# Altium footprint library pcb.PcbLib: 20 footprints (part 1 of 2)
Each footprint in its own frame and in the unit in brackets; x right, y up, seen from the top. Pads: shape width x height; smd on the part's side, far side on the other; paste and mask are expansions set on the pad; w line width, h text height; cw(c..) or ccw(c..) is an arc to the next point about the centre after c.
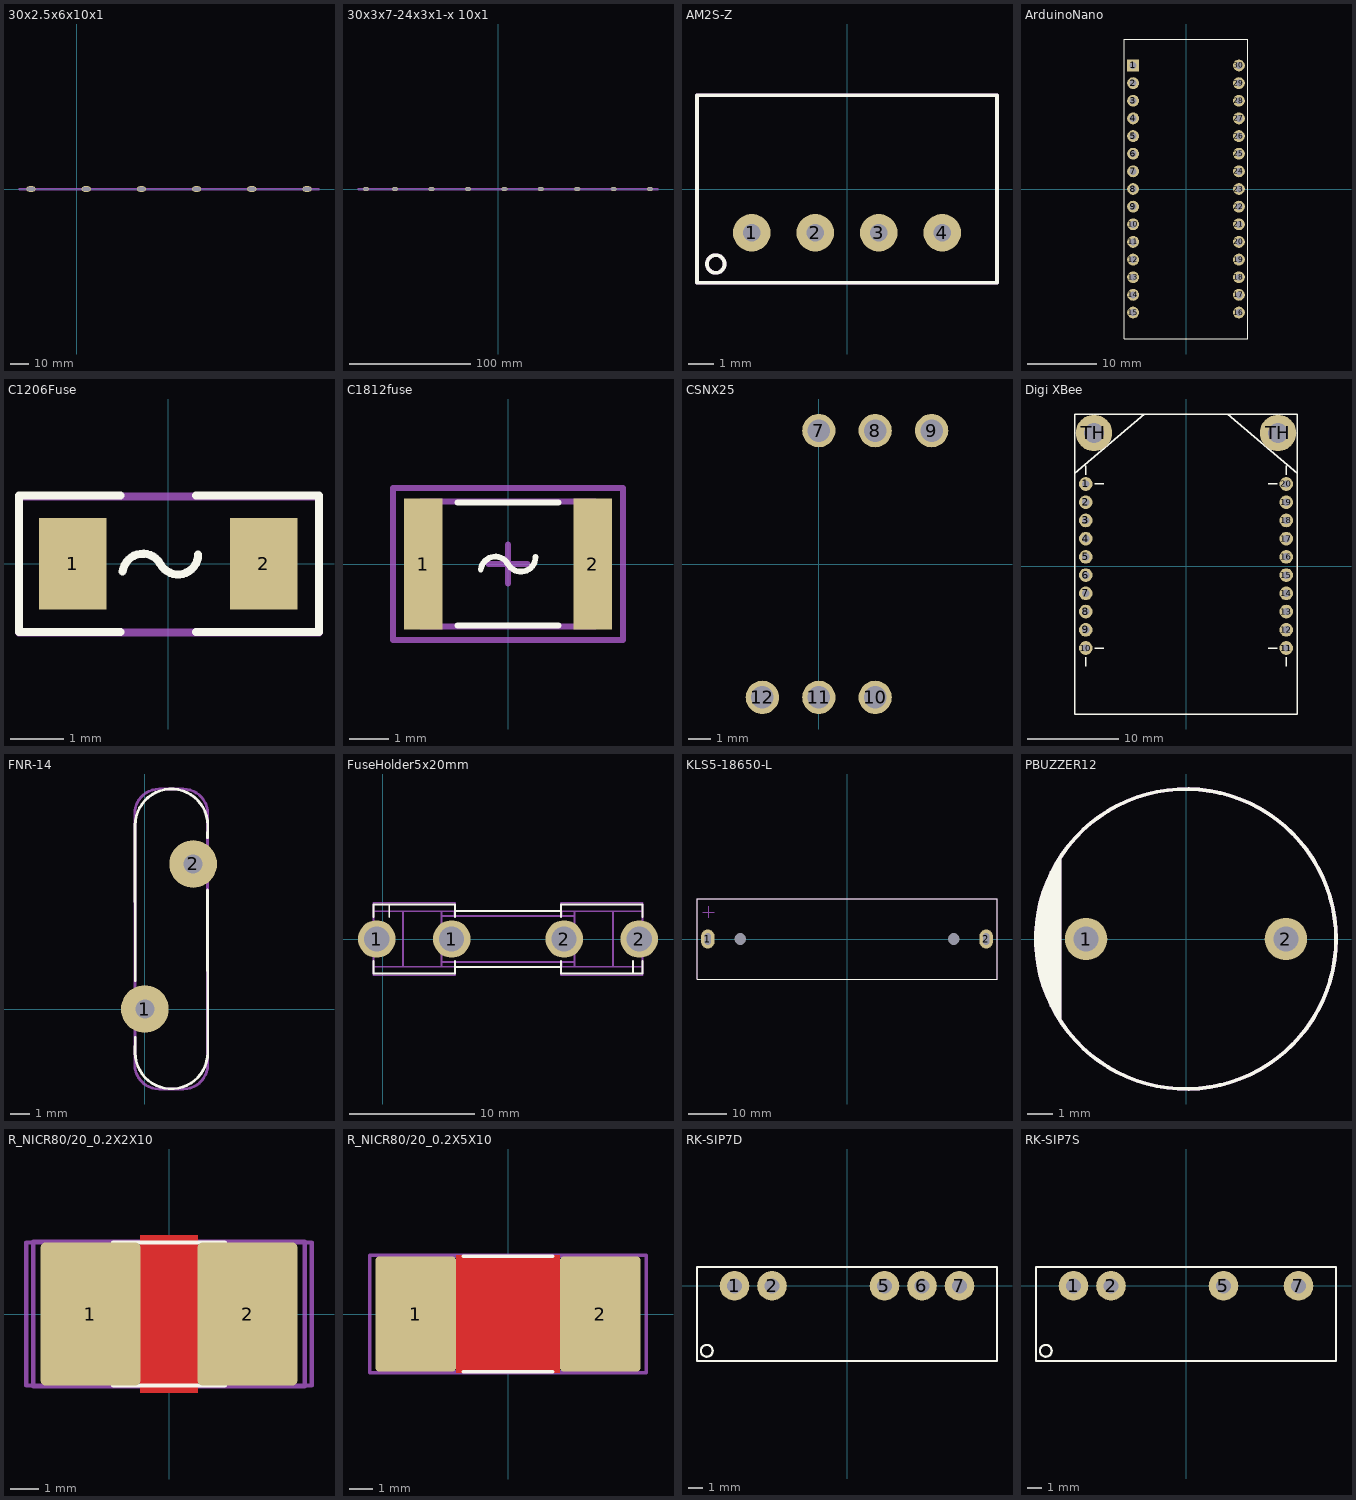
[diagram p0: the footprints below, top view; thin cyan lines are the x and y axes]

## 30х2.5х6х10х1 [mm]
height 10
pads (6):
  oval 5x3 hole 2 slot 4 at 0 deg: 0(-25,0) 0(5,0) 0(35,0) 0(65,0) 0(95,0) 0(125,0)
Top Assembly:
  lines w0.15: -31.5,-0.5 -31.5,0.5 131.5,0.5 131.5,-0.5 -31.5,-0.5
3D body "Шина 30х2.5х6 х 10х1.STEP": height 11, standoff -4, extent -31.5,-0.5 131.5,0.5

## 30х3х7-24х3х1-х 10х1 [mm]
height 10
pads (9):
  oval 5x3 hole 2 slot 4 at 0 deg: 0(-109,0) 0(-85,0) 0(-55,0) 0(-25,0) 0(5,0) 0(35,0) 0(65,0) 0(95,0) 0(125,0)
Top Assembly:
  lines w0.15: -115.5,-0.5 131.5,-0.5 131.5,0.5 -115.5,0.5 -115.5,-0.5
3D body "Шина 30х3х7-24х3х1-х 10х1.STEP": height 11, standoff -4, extent -115.5,-0.5 131.5,0.5

## AM2S-Z [mm]
height 11
pads (4):
  round 1.5 hole 0.7: 1(-3.81,-1.75) 2(-1.27,-1.75) 3(1.27,-1.75) 4(3.81,-1.75)
Top Overlay:
  circle w0.15: c-5.25,-3 r0.354
  lines w0.15: -6,-3.75 6,-3.75 6,3.75 -6,3.75 -6,-3.75
Top Assembly:
  circle w0.15: c-5.25,-3 r0.354
  lines w0.15: -6,-3.75 -6,3.75 6,3.75 6,-3.75 -6,-3.75
  text ".Designator" at -3,0.2 h1
3D body "AM2S-Z.STEP": height 9.65, standoff -2.5, extent -5.84,-3.75 5.84,3.75

## ArduinoNano [mm]
pads (30):
  rect 1.7x1.7 hole 1: 1(-7.62,17.78)
  round 1.7 hole 1: 2(-7.62,15.24) 3(-7.62,12.7) 4(-7.62,10.16) 5(-7.62,7.62) 6(-7.62,5.08) 7(-7.62,2.54) 8(-7.62,0) 9(-7.62,-2.54) 10(-7.62,-5.08) 11(-7.62,-7.62) 12(-7.62,-10.16) 13(-7.62,-12.7) 14(-7.62,-15.24) 15(-7.62,-17.78) 16(7.62,-17.78) 17(7.62,-15.24) 18(7.62,-12.7) 19(7.62,-10.16) 20(7.62,-7.62) 21(7.62,-5.08) 22(7.62,-2.54) 23(7.62,0) 24(7.62,2.54) 25(7.62,5.08) 26(7.62,7.62) 27(7.62,10.16) 28(7.62,12.7) 29(7.62,15.24) 30(7.62,17.78)
Top Overlay:
  lines w0.15: -8.89,-21.59 8.89,-21.59 8.89,21.59 -8.89,21.59 -8.89,-21.59
3D body "arduino_nano.STEP": height 12.6, standoff -6, extent -9,-21.6 9,23.4

## C1206Fuse [mm]
pads (2):
  rect 1.25x1.7 smd: 1(-1.775,0) 2(1.775,0)
Top Overlay:
  lines w0.15: -0.886,-1.27 -2.775,-1.27 -2.775,1.27 -0.886,1.27 ; -0.848,-0.142 cw(c-0.476,-0.186) -0.15,0 ccw(c0.18,0.178) 0.555,0.178 ; 0.511,-1.27 2.797,-1.27 2.797,1.27 0.511,1.27
Top Assembly:
  lines w0.15: -2.775,-1.275 -2.775,1.25 2.8,1.25 2.8,-1.275 -2.775,-1.275
  text ".Designator" at -2.5,-0.3 h1
3D body "User Library-nona SMD075F.STEP": height 0.56, standoff 0, extent -1.851,-0.85 1.351,0.802

## C1812fuse [mm]
height 1
pads (2):
  rect 1x3.35 smd: 1(-2.175,0) 2(2.175,0)
Top Overlay:
  lines w0.15: -1.3,-1.575 1.3,-1.575 ; -1.3,1.575 1.3,1.575 ; -0.698,-0.142 cw(c-0.326,-0.186) 0,0 ccw(c0.33,0.178) 0.705,0.178
Mechanical 15:
  lines w0.15: -0.5,0 0.5,0 ; 0,-0.5 0,0.5 ; -2.95,-1.95 2.95,-1.95 2.95,1.95 -2.95,1.95 -2.95,-1.95
Top Assembly:
  lines w0.15: -2.25,-1.6 2.25,-1.6 2.25,1.6 -2.25,1.6 -2.25,-1.6
  text ".Designator" at -2,-0.4 h1
3D body "C1812C.step": height 1, standoff 0, extent -2.25,-1.6 2.25,1.6

## CSNX25 [mm]
height 25.5
pads (6):
  round 1.5 hole 1: 7(0,6) 8(2.54,6) 9(5.08,6) 10(2.54,-6) 11(0,-6) 12(-2.54,-6)

## Digi XBee [mm]
pads (24):
  round 1.5 hole 0.8: 1(-11,9) 2(-11,7) 3(-11,5) 3(-11,5) 4(-11,3) 5(-11,1) 6(-11,-1) 7(-11,-3) 8(-11,-5) 9(-11,-7) 10(-11,-9) 11(11,-9) 11(11,-9) 12(11,-7) 13(11,-5) 14(11,-3) 15(11,-1) 16(11,1) 17(11,3) 18(11,5) 19(11,7) 20(11,9)
  round 4 hole 2.2: TH(-10.1,14.6) TH(10.1,14.6)
Top Overlay:
  lines w0.15: -11,-11 -11,-10 ; -11,10 -11,11 ; -10,-9 -9,-9 ; -10,9 -9,9 ; 4.191,16.679 12.192,16.679 12.192,10.177 ; 9,-9 10,-9 ; 9,9 10,9 ; 11,-11 11,-10 ; 11,10 11,11 ; -12.192,10.177 -12.192,-16.239 12.192,-16.239 12.192,10.177 ; -12.192,10.177 -4.572,16.679 ; -12.192,10.177 -12.192,16.679 -4.572,16.679 ; -4.572,16.679 4.572,16.679 12.192,10.177

## FNR-14 [mm]
pads (2):
  round 2.5 hole 1: 1(0,0) 2(2.54,7.62)
Top Overlay:
  lines w0.15: -0.5,-1.5 -0.508,-2.286 ccw(c1.397,-2.286) 3.302,-2.286 3.3,6.25 ; -0.5,1.5 -0.508,9.652 cw(c1.397,9.652) 3.302,9.652 3.3,9
Top Assembly:
  lines w0.15: -0.525,-2.93 ccw(c0.745,-2.93) 0.745,-4.2 2.03,-4.2 ccw(c2.03,-2.93) 3.3,-2.93 3.3,3.625 3.3,10.28 ccw(c2.03,10.28) 2.03,11.55 1.5,11.55 0.745,11.55 ccw(c0.745,10.28) -0.525,10.28 -0.525,3.725 -0.525,-2.93
  text ".Designator" at 0,3.2 h1

## FuseHolder5x20mm [mm] "Schurter Fuse Holder 0751.0110"
height 10
pads (4):
  round 3 hole 2: 1(-0.5,0) 1(5.5,0) 2(14.5,0) 2(20.5,0)
Top Overlay:
  lines w0.15: -0.75,-1.75 -0.75,-2.75 5.75,-2.75 5.75,-1.75 ; -0.75,1.75 -0.75,2.75 5.75,2.75 5.75,1.75 ; 0.5,1.75 0.5,2.75 ; 5.75,-2.25 14.25,-2.25 ; 5.75,2.25 14.25,2.25 ; 14.25,-1.75 14.25,-2.75 20.75,-2.75 20.75,-1.75 ; 14.25,1.75 14.25,2.75 20.75,2.75 20.75,1.75 ; 20,-2.75 20,-1.75
Top Assembly:
  lines w0.15: 1.6,2.225 1.6,-2.225 4.675,-2.225 4.675,2.225 2.1,2.225 ; 4.675,-1.825 15.325,-1.825 15.325,1.825 4.675,1.825 ; 5.725,1.825 5.725,2.225 5.75,2.225 ; 5.75,-1.875 5.75,-2.225 ; 14.275,-1.825 14.275,-2.225 14.25,-2.225 ; 14.275,1.825 14.275,2.225 14.25,2.225 ; 15.325,-2.225 15.325,2.225 ; 18.4,-2.225 18.4,2.225 ; -0.75,-2.225 -0.75,2.225 ; -0.75,-2.225 -0.75,-2.9 5.75,-2.9 5.75,-2.225 ; -0.75,-2.225 5.75,-2.225 ; -0.75,2.225 -0.75,2.9 5.75,2.9 5.75,2.225 ; -0.75,2.225 5.75,2.225 ; 14.25,-2.225 14.25,-2.9 20.75,-2.9 20.75,-2.225 ; 14.25,-2.225 20.75,-2.225 ; 14.25,2.225 14.25,2.9 20.75,2.9 20.75,2.225 ; 14.25,2.225 20.75,2.225 ; 20.75,-2.225 20.75,2.225
  text ".Designator" at 7,-0.3 h1
3D body "half-fuse-holder.STEP": height 9.86, standoff -3.33, extent 14.476,-3.1 20.576,3.1
3D body "half-fuse-holder.STEP": height 9.86, standoff -3.33, extent -0.51,-3.1 5.59,3.1
3D body "User Library-FUSIVEL.STEP": height 9.5, standoff 4.5, extent 0,-2.5 20,2.5

## KLS5-18650-L [mm]
height 21.5
pads (4):
  oval 3.5x5 hole 3 slot 1.5 at 0 deg: 1(-36.2,0) 2(36.2,0)
  round 0 hole 3 unplated: TH(-27.8,0) TH(27.8,0)
Top Overlay:
  lines w0.15: -39,-10.5 -39,0 -39,10.5 0,10.5 39,10.5 39,0 39,-10.5 0,-10.5 -39,-10.5
Top Assembly:
  lines w0.15: -37.5,7 -34.5,7 ; -36,5.5 -36,8.5 ; -39,-10.5 -39,10.5 39,10.5 39,-10.5 -39,-10.5
  text ".Designator" at -3,-0.3 h1
3D body "batcase18650.STEP": height 21.65, standoff -3.83, extent -38.825,-10.4 38.825,10.4

## PBUZZER12 [mm]
height 10
pads (2):
  round 1.7 hole 1 unplated: 1(-4,0) 2(4,0)
Top Overlay:
  circle w0.15: c0,0 r6
  region: -5,-3.254 -5.121,-3.07 -5.337,-2.687 -5.524,-2.29 -5.681,-1.879 -5.808,-1.459 -5.904,-1.03 -5.968,-0.595 -6,-0.157 -6,0.063 -6,0.283 -5.968,0.721 -5.904,1.156 -5.808,1.585 -5.681,2.005 -5.524,2.416 -5.337,2.814 -5.121,3.197 -5,3.38
Top Assembly:
  circle w0.15: c0,0 r6
  region: -5,-3.254 -5.121,-3.07 -5.337,-2.687 -5.524,-2.29 -5.681,-1.879 -5.808,-1.459 -5.904,-1.03 -5.968,-0.595 -6,-0.157 -6,0.063 -6,0.283 -5.968,0.721 -5.904,1.156 -5.808,1.585 -5.681,2.005 -5.524,2.416 -5.337,2.814 -5.121,3.197 -5,3.38
  text ".Designator" at -2,-0.3 h1
3D body: height 3, standoff -3, extent 3.703,-0.299 4.3,0.3
3D body: height 3, standoff -3, extent -4.297,-0.299 -3.7,0.3
3D body: height 7, standoff 1, extent -5.5,-5.5 5.5,5.5
3D body: height 9, standoff 1, extent -6,-5.999 5.999,6
3D body: height 8, standoff 2, extent -5.5,-5.5 5.5,5.5

## R_NICR80/20_0.2X2X10 [mm] "Лента нихромовая Х20Н80 0,2х2x10мм"
height 0.2
pads (2):
  rrect10% 3.5x5 smd: 1(-2.75,0) 2(2.75,0)
Top Layer:
  pour cut-out: -1,2.75 1,2.75 1,-2.75 -1,-2.75
Top Overlay:
  lines w0.15: -1.95,-2.5 1.95,-2.5 ; -1.95,2.5 1.95,2.5
Mechanical 15:
  lines w0.15: -0.5,0 0.5,0 ; 0,-0.5 0,0.5 ; -4.75,-2.54 4.75,-2.54 4.75,2.54 -4.75,2.54 -4.75,-2.54
Top Assembly:
  lines w0.15: -5,-2.5 -5,2.5 5,2.5 5,-2.5 -5,-2.5
  text ".Designator" at -3,-0.3 h1
3D body: height 0.2, standoff 0, extent -4,-2.5 4,2.5

## R_NICR80/20_0.2X5X10 [mm] "Лента нихромовая Х20Н80 0,2х5x10мм"
height 0.2
pads (2):
  rrect10% 3.5x5 smd: 1(-4,0) 2(4,0)
Top Layer:
  pour cut-out: -2.25,2.54 2.25,2.54 2.25,-2.54 -2.25,-2.54
Top Overlay:
  lines w0.15: -1.95,-2.5 1.95,-2.5 ; -1.95,2.5 1.95,2.5
Mechanical 15:
  lines w0.15: -0.5,0 0.5,0 ; 0,-0.5 0,0.5 ; -6,-2.54 -6,2.54 6,2.54 6,-2.54 -6,-2.54
Top Assembly:
  lines w0.15: -5,-2.5 5,-2.5 5,2.5 -5,2.5 -5,-2.5
  text ".Designator" at -3,-0.3 h1
3D body: height 0.2, standoff 0, extent -5,-2.5 5,2.5

## RK-SIP7D [mm]
height 10.2
pads (5):
  round 2 hole 1: 1(-7.62,0) 2(-5.08,0) 5(2.54,0) 6(5.08,0) 7(7.62,0)
Top Overlay:
  circle w0.15: c-9.5,-4.4 r0.4
  lines w0.15: -10.16,-5.08 10.16,-5.08 10.16,1.27 -10.16,1.27 -10.16,-5.08
3D body: height 10.2, standoff 0, extent -10.159,-5.079 10.159,1.269

## RK-SIP7S [mm]
height 10.2
pads (4):
  round 2 hole 1: 1(-7.62,0) 2(-5.08,0) 5(2.54,0) 7(7.62,0)
Top Overlay:
  circle w0.15: c-9.5,-4.4 r0.4
  lines w0.15: -10.16,-5.08 -10.16,1.27 10.16,1.27 10.16,-5.08 -10.16,-5.08
3D body: height 10.2, standoff 0, extent -10.159,-5.079 10.159,1.269